# Altium footprint library 单平台共享多内核实验平台研制与应用.PcbLib: 46 footprints (part 3 of 3)
Each footprint in its own frame and in the unit in brackets; x right, y up, seen from the top. Pads: shape width x height; smd on the part's side, far side on the other; paste and mask are expansions set on the pad; w line width, h text height; cw(c..) or ccw(c..) is an arc to the next point about the centre after c.
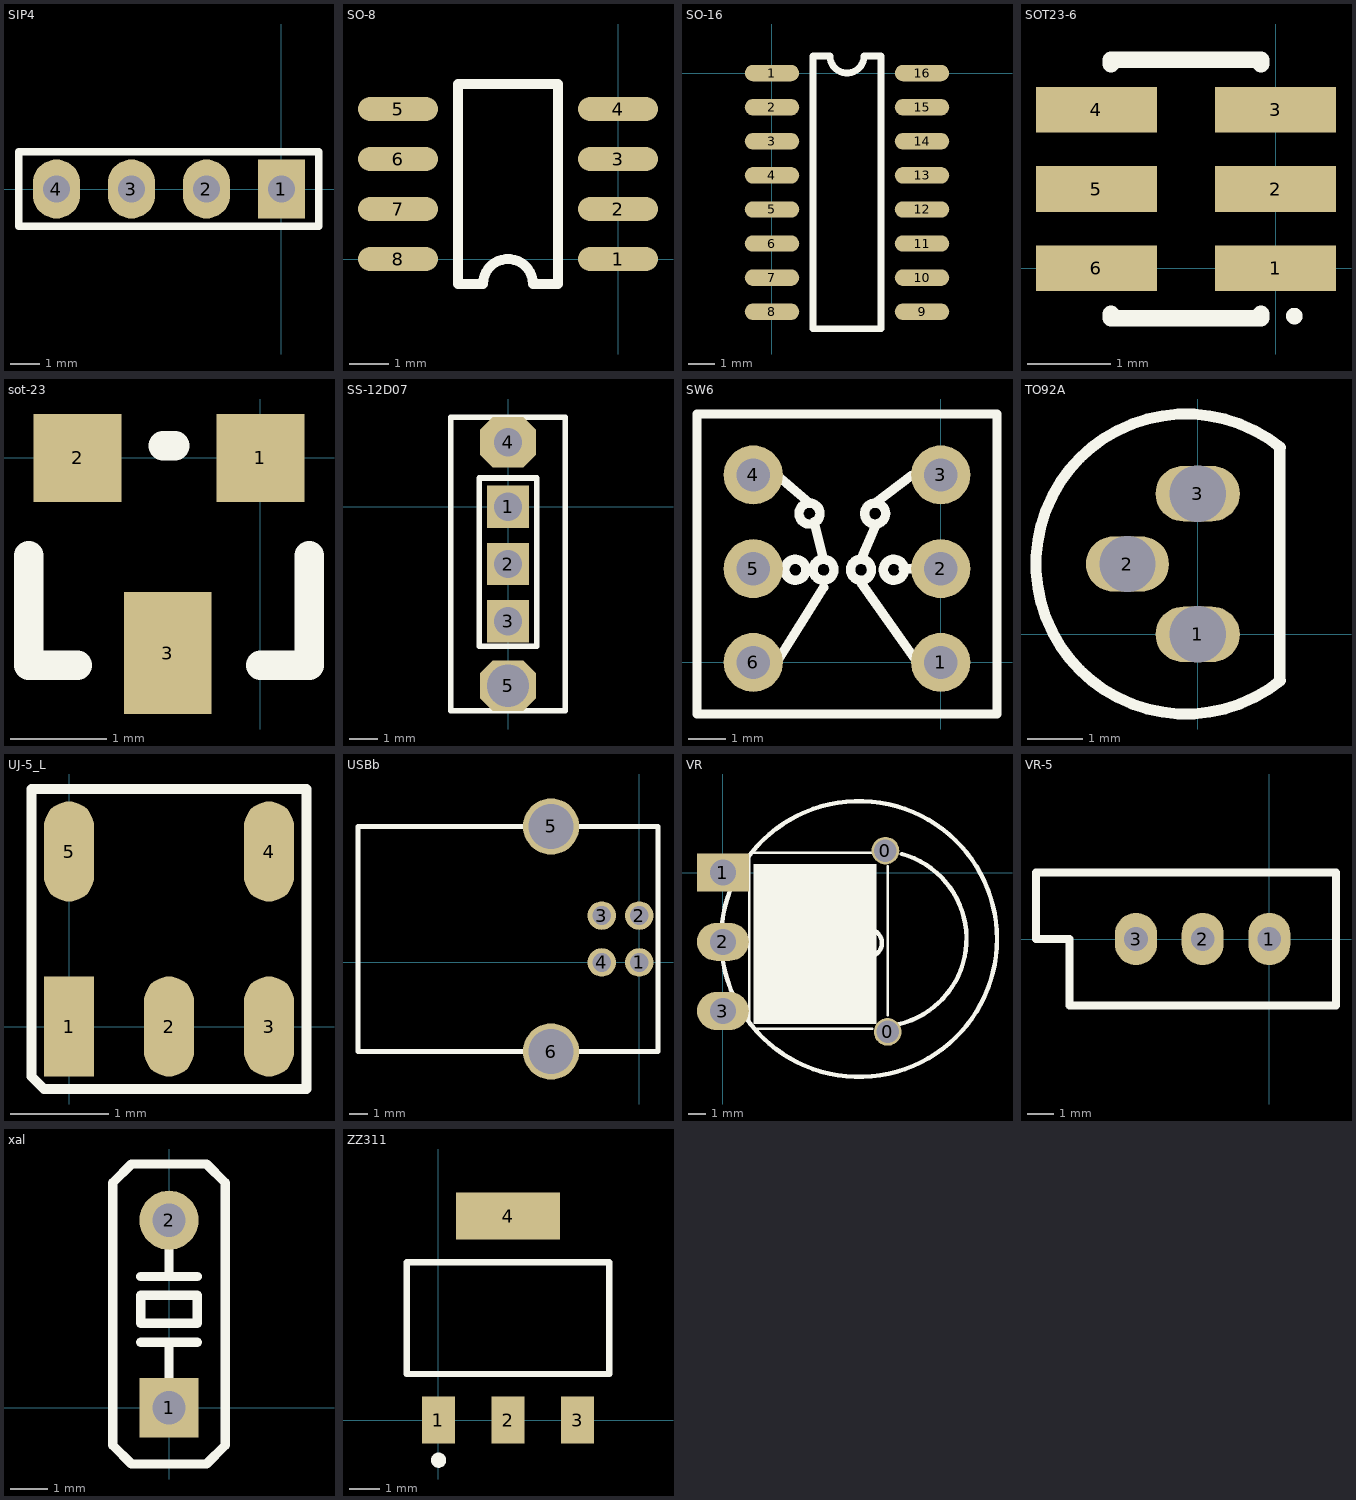
[diagram p2: the footprints below, top view; thin cyan lines are the x and y axes]

## SIP4 [mm]
pads (4):
  rect 1.6x2 hole 0.9: 1(0,0)
  oval 1.6x2 hole 0.9: 2(-2.54,0) 3(-5.08,0) 4(-7.62,0)
Top Overlay:
  lines w0.254: -8.89,-1.27 1.27,-1.27 1.27,1.27 -8.89,1.27 -8.89,-1.27

## SO-8 [mil]
pads (8):
  oval 80x24 smd: 1(0,0) 2(0,50) 3(0,100) 4(0,150) 5(-220,150) 6(-220,100) 7(-220,50) 8(-220,0)
Top Overlay:
  lines w10: -160,-25 -135,-25 cw(c-110,-25) -85,-25 -60,-25 -60,175 -160,175 -160,-25

## SO-16 [mil]
pads (16):
  oval 80x24 smd: 1(0,0) 2(0,-50) 3(0,-100) 4(0,-150) 5(0,-200) 6(0,-250) 7(0,-300) 8(0,-350) 9(220,-350) 10(220,-300) 11(220,-250) 12(220,-200) 13(220,-150) 14(220,-100) 15(220,-50) 16(220,0)
Top Overlay:
  lines w10: 60,-375 60,25 85,25 ccw(c110,25) 135,25 160,25 160,-375 60,-375

## SOT23-6 [mm]
pads (6):
  rect 1.45x0.55 smd: 1(0,0) 2(0,0.95) 3(0,1.9) 4(-2.15,1.9) 5(-2.15,0.95) 6(-2.15,0)
Top Overlay:
  circle w0.1: c0.225,-0.575 r0.05
  lines w0.2: -1.975,-0.55 -1.975,-0.6 -0.175,-0.6 -0.175,-0.55 ; -1.975,2.45 -1.975,2.5 -0.175,2.5 -0.175,2.45

## sot-23 [mil]
pads (3):
  rect 36x36 smd: 1(0,0) 2(-75,0)
  rect 36x50 smd: 3(-38,-80)
Top Overlay:
  lines w12: -95,-40 -95,-85 -75,-85 ; -40,5 -35,5 ; 0,-85 20,-85 20,-40

## SS-12D07 [mm]
pads (5):
  rect 1.5x1.5 hole 1: 1(0,0) 2(0,-2.032) 3(0,-4.064)
  oct 2x1.8 hole 1: 4(0,2.286)
  oct 2x1.8 hole 1.5: 5(0,-6.35)
Top Overlay:
  lines w0.2: -2.032,-7.239 -2.032,3.175 2.032,3.175 2.032,-7.239 -2.032,-7.239 ; -1.016,-4.953 1.016,-4.953 1.016,1.016 -1.016,1.016 -1.016,-4.953

## SW6 [mm]
pads (6):
  round 1.6 hole 0.9: 1(0,0) 2(0,2.54) 3(0,5.08) 4(-5.08,5.08) 5(-5.08,2.54) 6(-5.08,0)
Top Overlay:
  circle w0.254: c-3.175,2.51 r0.284
  circle w0.254: c-2.159,2.51 r0.284
  circle w0.254: c-1.27,2.51 r0.284
  circle w0.254: c-3.937,2.51 r0.284
  circle w0.254: c-3.556,4.034 r0.284
  circle w0.254: c-1.778,4.034 r0.284
  lines w0.254: -4.445,0 -3.175,2.032 ; -4.445,2.54 -4.318,2.54 ; -4.445,5.08 -3.556,4.318 ; -3.429,3.81 -3.175,2.794 ; -2.159,2.159 -0.635,0 ; -2.159,2.794 -1.778,3.683 ; -1.778,4.318 -0.762,5.08 ; -1.016,2.54 -0.762,2.54 ; -6.604,-1.397 -6.604,6.731 1.524,6.731 1.524,-1.397 -6.604,-1.397

## TO92A [mil]
pads (3):
  oval 60x39.37 hole 40: 1(0,0) 3(0,100)
  oval 59.06x39.37 hole 40: 2(-50,50)
Top Overlay:
  lines w7.87: 58.33,-33.33 58.33,133.33 ; 58.79,-32.9 cw(c-8.33,50) 58.79,132.9

## UJ-5_L [mil]
pads (5):
  rect 20x40 smd: 1(0,0)
  oval 20x40 smd: 2(40,0) 3(80,0) 4(80,70) 5(0,70)
Top Overlay:
  lines w3.94: -15,-20 -15,20 -15,95 95,95 95,-25 20,-25 15,-25 -10,-25 -15,-20

## USBb [mm]
pads (6):
  round 1.524 hole 1: 1(0,0) 2(0,2.5) 3(-2,2.5) 4(-2,0)
  round 3 hole 2.4: 5(-4.7,7.25) 6(-4.7,-4.75)
Top Overlay:
  lines w0.254: -15,-4.75 1,-4.75 1,7.25 -15,7.25 -15,-4.75

## VR [mm]
pads (5):
  round 1.6 hole 1.3: 0(9.398,1.27) 0(9.525,-9.207)
  rect 3x2.2 hole 1.5: 1(0,0)
  oval 3x2.2 hole 1.5: 2(0,-4) 3(0,-8)
Top Overlay:
  circle w0.254: c8.382,-4.064 r0.813
  circle w0.254: c7.874,-3.835 r7.976
  region: 1.778,0.508 1.778,-8.763 8.89,-8.763 8.89,0.508
  lines w0.15: 1.524,-8.763 1.524,0.889 ; 1.651,1.143 8.636,1.143 ; 1.778,-9.017 8.636,-9.017 ; 9.525,-8.255 9.525,0.381
  lines w0.254: 0,-0.254 0,0.254 ; 8.833,1.2 8.89,1.143 ; 10.16,-8.763 ccw(c9.004,-3.816) 10.351,1.082

## VR-5 [mm]
pads (3):
  oval 1.6x2 hole 0.9: 1(0,0) 2(-2.54,0) 3(-5.08,0)
Top Overlay:
  lines w0.305: -8.89,0 -8.89,2.54 2.54,2.54 2.54,-2.54 -7.62,-2.54 -7.62,0 -8.89,0

## xal [mm]
pads (2):
  rect 1.6x1.6 hole 0.9: 1(0,0)
  round 1.6 hole 0.9: 2(0,5.08)
Top Overlay:
  lines w0.254: -0.762,1.778 0.762,1.778 ; -0.762,3.556 0.762,3.556 ; 0,1.27 0,0.635 0,1.778 ; 0,3.556 0,4.572 ; 0,3.81 0,4.445 ; -1.524,-1.016 -1.524,6.096 -1.016,6.604 1.016,6.604 1.524,6.096 1.524,-1.016 1.016,-1.524 -1.016,-1.524 -1.524,-1.016 ; -0.762,2.286 0.762,2.286 0.762,3.048 -0.762,3.048 -0.762,2.286

## ZZ311 [mm]
pads (4):
  rect 1.1x1.55 smd: 1(0,0) 2(2.3,0) 3(4.6,0)
  rect 3.45x1.55 smd: 4(2.3,6.75)
Top Overlay:
  circle w0.25: c0,-1.325 r0.125
  lines w0.2: -1.05,1.525 -1.05,5.225 5.65,5.225 5.65,1.525 -1.05,1.525